# Altium footprint library cool_library.PcbLib: 1182 footprints (part 15 of 75)
Each footprint in its own frame and in the unit in brackets; x right, y up, seen from the top. Pads: shape width x height; smd on the part's side, far side on the other; paste and mask are expansions set on the pad; w line width, h text height; cw(c..) or ccw(c..) is an arc to the next point about the centre after c.
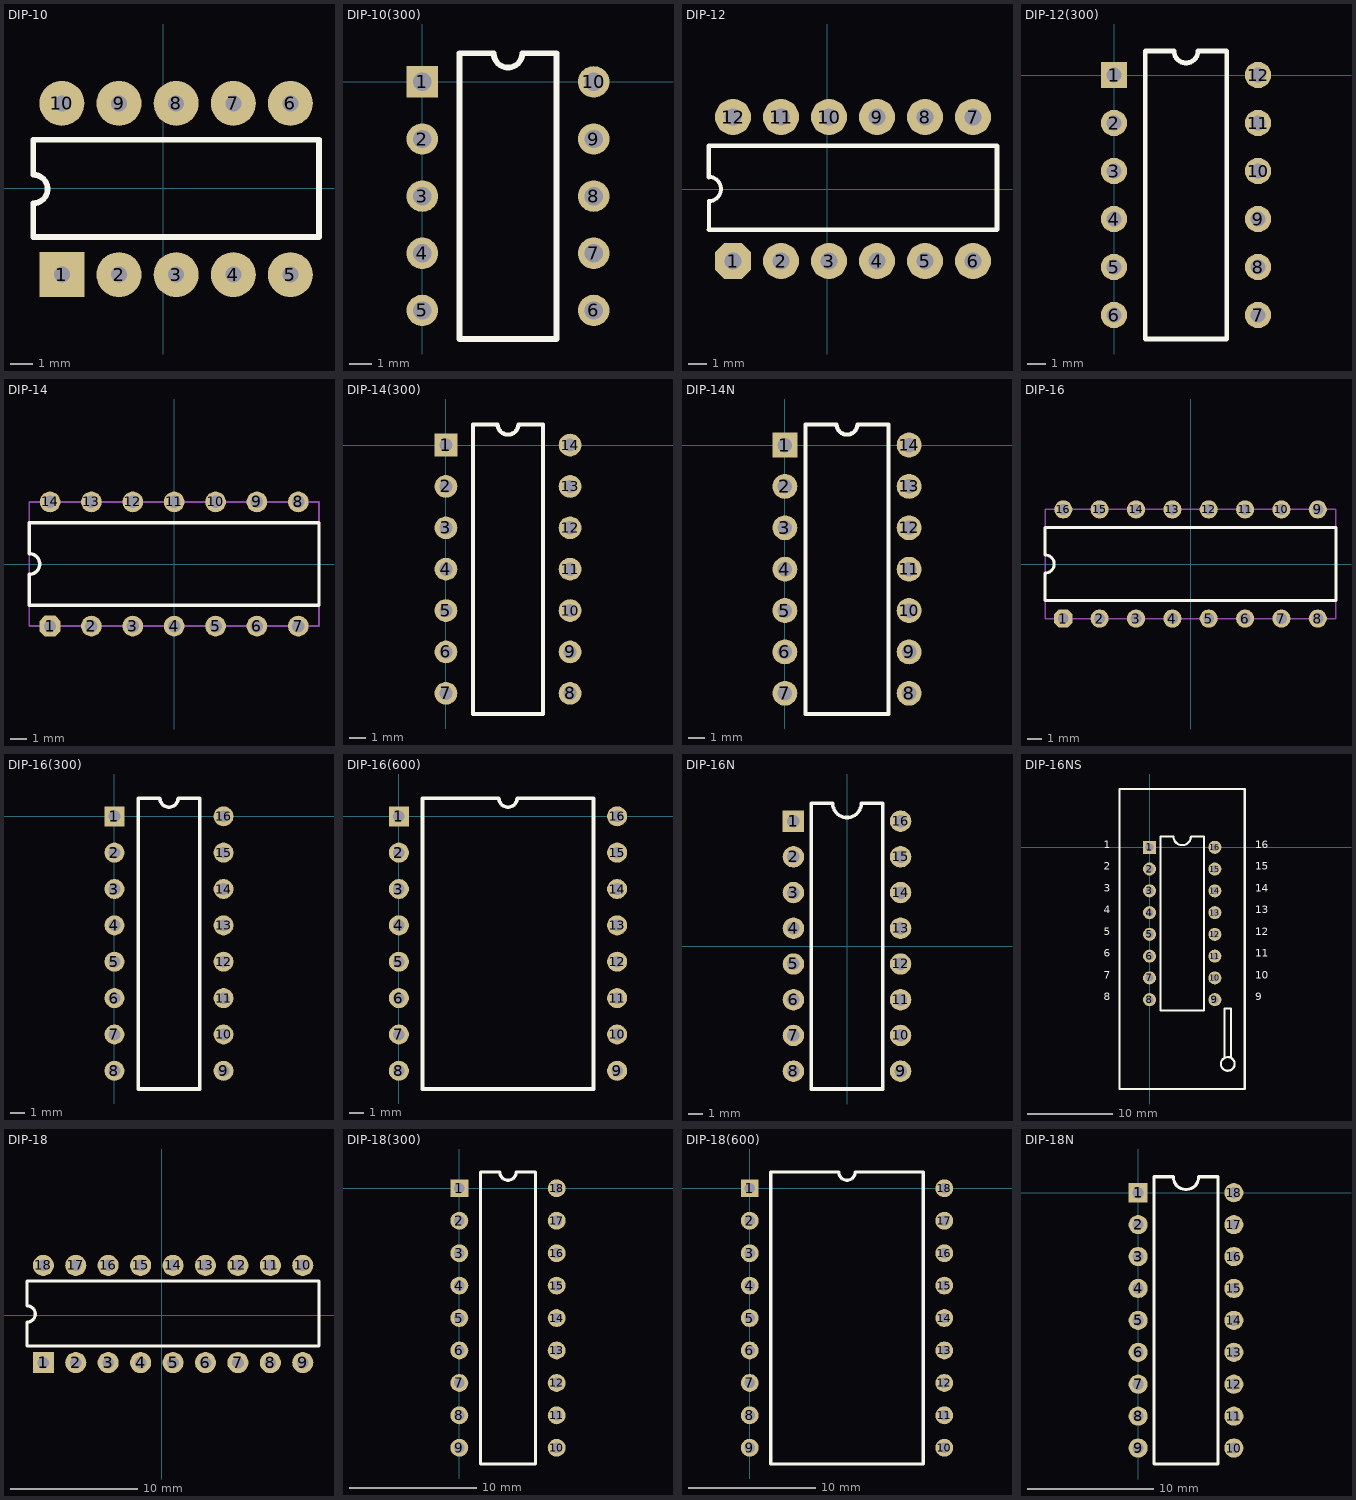
[diagram p14: the footprints below, top view; thin cyan lines are the x and y axes]

## DIP-10 [mm]
pads (10):
  rect 2x2 hole 0.711: 1(-4.518,-3.839)
  round 2 hole 0.711: 2(-1.978,-3.839) 3(0.562,-3.839) 4(3.102,-3.839) 5(5.642,-3.839) 6(5.642,3.781) 7(3.102,3.781) 8(0.562,3.781) 9(-1.978,3.781) 10(-4.518,3.781)
Top Overlay:
  lines w0.254: -5.788,-2.159 -5.788,-0.664 ccw(c-5.788,-0.029) -5.788,0.606 -5.788,2.159 6.912,2.159 6.912,-2.159 -5.788,-2.159
3D body: height 4.5, standoff 0.7, extent -5.789,-3.64 6.913,3.562

## DIP-10(300) [mil]
pads (10):
  rect 55x55 hole 32: 1(0,0)
  round 55 hole 32: 2(0,-100) 3(0,-200) 4(0,-300) 5(0,-400) 6(300,-400) 7(300,-300) 8(300,-200) 9(300,-100) 10(300,0)
Top Overlay:
  lines w10: 65,-450 65,50 125,50 ccw(c150,50) 175,50 235,50 235,-450 65,-450

## DIP-12 [mil]
pads (12):
  oct 75x75 hole 36: 1(-196,-150)
  round 75 hole 36: 2(-96,-150) 3(4,-150) 4(104,-150) 5(204,-150) 6(304,-150) 7(304,150) 8(204,150) 9(104,150) 10(4,150) 11(-96,150) 12(-196,150)
Top Overlay:
  lines w8: -246,-85 -246,-25 ccw(c-246,0) -246,25
  lines w10: -246.31,25.13 -246.31,90 354,90 354,-85 -246,-85
3D body: height 177.17, standoff 27.56, extent -251.31,-145 359,145
3D body: height 0, standoff 0, extent -246.34,-140.02 354.02,140.02

## DIP-12(300) [mil]
pads (12):
  rect 55x55 hole 32: 1(0,0)
  round 55 hole 32: 2(0,-100) 3(0,-200) 4(0,-300) 5(0,-400) 6(0,-500) 7(300,-500) 8(300,-400) 9(300,-300) 10(300,-200) 11(300,-100) 12(300,0)
Top Overlay:
  lines w10: 65,-550 65,50 125,50 ccw(c150,50) 175,50 235,50 235,-550 65,-550

## DIP-14 [mil]
pads (14):
  oct 50x50 hole 30: 1(-300,-150)
  round 50 hole 30: 2(-200,-150) 3(-100,-150) 4(0,-150) 5(100,-150) 6(200,-150) 7(300,-150) 8(300,150) 9(200,150) 10(100,150) 11(0,150) 12(-100,150) 13(-200,150) 14(-300,150)
Top Overlay:
  lines w8: -350,-100 350,-100 350,100 -350,100 -350,25 cw(c-350,0) -350,-25 -350,-100
Mechanical 1:
  lines w4: -350,-150 -350,150 350,150 350,-150 -350,-150

## DIP-14(300) [mil]
pads (14):
  rect 55x55 hole 32: 1(0,0)
  round 55 hole 32: 2(0,-100) 3(0,-200) 4(0,-300) 5(0,-400) 6(0,-500) 7(0,-600) 8(300,-600) 9(300,-500) 10(300,-400) 11(300,-300) 12(300,-200) 13(300,-100) 14(300,0)
Top Overlay:
  lines w10: 65,-650 235,-650 235,50 175,50 cw(c150,50) 125,50 65,50 65,-650

## DIP-14N [mil]
pads (14):
  rect 60x60 hole 35: 1(0,0)
  round 60 hole 35: 2(0,-100) 3(0,-200) 4(0,-300) 5(0,-400) 6(0,-500) 7(0,-600) 8(300,-600) 9(300,-500) 10(300,-400) 11(300,-300) 12(300,-200) 13(300,-100) 14(300,0)
Top Overlay:
  lines w10: 50,-650 250,-650 250,50 175,50 cw(c150,50) 125,50 50,50 50,-650

## DIP-16 [mil]
pads (16):
  oct 50x50 hole 30: 1(-350,-150)
  round 50 hole 30: 2(-250,-150) 3(-150,-150) 4(-50,-150) 5(50,-150) 6(150,-150) 7(250,-150) 8(350,-150) 9(350,150) 10(250,150) 11(150,150) 12(50,150) 13(-50,150) 14(-150,150) 15(-250,150) 16(-350,150)
Top Overlay:
  lines w8: -400,-100 -400,-25 ccw(c-400,0) -400,25 -400,100 400,100 400,-100 -400,-100
Mechanical 1:
  lines w4: -400,-150 -400,150 400,150 400,-150 -400,-150

## DIP-16(300) [mil]
pads (16):
  rect 55x55 hole 32: 1(0,0)
  round 55 hole 32: 2(0,-100) 3(0,-200) 4(0,-300) 5(0,-400) 6(0,-500) 7(0,-600) 8(0,-700) 9(300,-700) 10(300,-600) 11(300,-500) 12(300,-400) 13(300,-300) 14(300,-200) 15(300,-100) 16(300,0)
Top Overlay:
  lines w10: 65,-750 235,-750 235,50 175,50 cw(c150,50) 125,50 65,50 65,-750

## DIP-16(600) [mil]
pads (16):
  rect 55x55 hole 32: 1(0,0)
  round 55 hole 32: 2(0,-100) 3(0,-200) 4(0,-300) 5(0,-400) 6(0,-500) 7(0,-600) 8(0,-700) 9(600,-700) 10(600,-600) 11(600,-500) 12(600,-400) 13(600,-300) 14(600,-200) 15(600,-100) 16(600,0)
Top Overlay:
  lines w10: 65,-750 65,50 275,50 ccw(c300,50) 325,50 535,50 535,-750 65,-750

## DIP-16N [mil]
pads (16):
  rect 60x60 hole 35: 1(-150,350)
  round 60 hole 35: 2(-150,250) 3(-150,150) 4(-150,50) 5(-150,-50) 6(-150,-150) 7(-150,-250) 8(-150,-350) 9(150,-350) 10(150,-250) 11(150,-150) 12(150,-50) 13(150,50) 14(150,150) 15(150,250) 16(150,350)
Top Overlay:
  lines w10: -100,-400 100,-400 100,400 40,400 cw(c0,400) -40,400 -100,400 -100,-400

## DIP-16NS [mil]
pads (16):
  rect 60x60 hole 35: 1(0,0)
  round 60 hole 35: 2(0,-100) 3(0,-200) 4(0,-300) 5(0,-400) 6(0,-500) 7(0,-600) 8(0,-700) 9(300,-700) 10(300,-600) 11(300,-500) 12(300,-400) 13(300,-300) 14(300,-200) 15(300,-100) 16(300,0)
Top Overlay:
  circle w10: c359.38,-995 r31.5
  lines w10: 345,-965 345,-740 373.77,-740 373.77,-965 ; -137.4,-1110.24 -137.4,267.72 437.4,267.72 437.4,-1110.24 -137.4,-1110.24 ; 50,-750 50,50 110,50 ccw(c150,50) 190,50 250,50 250,-750 50,-750
  text "9" at 485,-715 h60
  text "10" at 485,-615 h60
  text "11" at 485,-515 h60
  text "12" at 485,-415 h60
  text "13" at 485,-315 h60
  text "14" at 485,-215 h60
  text "15" at 485,-115 h60
  text "7" at -210,-615 h60
  text "6" at -210,-515 h60
  text "5" at -210,-415 h60
  text "4" at -210,-315 h60
  text "3" at -210,-215 h60
  text "2" at -210,-115 h60
  text "1" at -210,-15 h60
  text "8" at -210,-715 h60
  text "16" at 485,-15 h60

## DIP-18 [mil]
pads (18):
  rect 65x65 hole 36: 1(-365.82,-146.42)
  round 65 hole 36: 2(-265.82,-146.42) 3(-165.82,-146.42) 4(-65.82,-146.42) 5(34.18,-146.42) 6(134.18,-146.42) 7(234.18,-146.42) 8(334.18,-146.42) 9(434.18,-146.42) 10(434.18,153.58) 11(334.18,153.58) 12(234.18,153.58) 13(134.18,153.58) 14(34.18,153.58) 15(-65.82,153.58) 16(-165.82,153.58) 17(-265.82,153.58) 18(-365.82,153.58)
Top Overlay:
  lines w10: -415.82,-95 484.18,-95 484.18,105 -415.82,105 -415.82,28.58 cw(c-415.82,3.58) -415.82,-21.42 -415.82,-95
3D body: height 179.92, standoff -150, extent -422.48,-148.93 492.48,158.94

## DIP-18(300) [mil]
pads (18):
  rect 55x55 hole 32: 1(0,0)
  round 55 hole 32: 2(0,-100) 3(0,-200) 4(0,-300) 5(0,-400) 6(0,-500) 7(0,-600) 8(0,-700) 9(0,-800) 10(300,-800) 11(300,-700) 12(300,-600) 13(300,-500) 14(300,-400) 15(300,-300) 16(300,-200) 17(300,-100) 18(300,0)
Top Overlay:
  lines w10: 65,-850 235,-850 235,50 175,50 cw(c150,50) 125,50 65,50 65,-850

## DIP-18(600) [mil]
pads (18):
  rect 55x55 hole 32: 1(0,0)
  round 55 hole 32: 2(0,-100) 3(0,-200) 4(0,-300) 5(0,-400) 6(0,-500) 7(0,-600) 8(0,-700) 9(0,-800) 10(600,-800) 11(600,-700) 12(600,-600) 13(600,-500) 14(600,-400) 15(600,-300) 16(600,-200) 17(600,-100) 18(600,0)
Top Overlay:
  lines w10: 65,-850 65,50 275,50 ccw(c300,50) 325,50 535,50 535,-850 65,-850

## DIP-18N [mil]
pads (18):
  rect 60x60 hole 35: 1(0,0)
  round 60 hole 35: 2(0,-100) 3(0,-200) 4(0,-300) 5(0,-400) 6(0,-500) 7(0,-600) 8(0,-700) 9(0,-800) 10(300,-800) 11(300,-700) 12(300,-600) 13(300,-500) 14(300,-400) 15(300,-300) 16(300,-200) 17(300,-100) 18(300,0)
Top Overlay:
  lines w10: 50,-850 250,-850 250,50 190,50 cw(c150,50) 110,50 50,50 50,-850